# Altium footprint library Generic Footprint.PcbLib: 160 footprints (part 17 of 20) (continued)
## Symbol_FCC-Logo-9x6mm_Silkscreen [mm] (continued)
1(3.918,3.695) 1(3.918,3.705) 1(3.918,3.715) 1(3.918,5.235) 1(3.918,5.245) 1(3.918,5.255) 1(3.928,0.971) 1(3.928,0.981) 1(3.928,0.992) 1(3.928,1.002) 1(3.928,2.481) 1(3.928,2.491) 1(3.928,2.501) 1(3.928,2.511) 1(3.928,2.532) 1(3.928,2.542) 1(3.928,2.562) 1(3.928,2.603) 1(3.928,2.613) 1(3.928,2.624) 1(3.928,2.634) 1(3.928,2.644) 1(3.928,3.603) 1(3.928,3.613) 1(3.928,3.623) 1(3.928,3.633) 1(3.928,3.695) 1(3.928,3.705) 1(3.928,3.715) 1(3.928,3.735) 1(3.928,3.746) 1(3.928,5.255) 1(3.928,5.265) 1(3.928,5.276) 1(3.938,0.961) 1(3.938,0.981) 1(3.938,0.992) 1(3.938,2.481) 1(3.938,2.562) 1(3.938,2.573) 1(3.938,2.583) 1(3.938,2.593) 1(3.938,3.644) 1(3.938,3.654) 1(3.938,3.664) 1(3.938,3.674) 1(3.938,3.684) 1(3.938,3.695) 1(3.938,3.725) 1(3.938,3.756) 1(3.938,3.766) 1(3.938,5.245) 1(3.938,5.265) 1(3.948,0.951) 1(3.948,0.971) 1(3.948,0.981) 1(3.948,2.44) 1(3.948,2.45) 1(3.948,2.46) 1(3.948,2.471) 1(3.948,2.481) 1(3.948,2.491) 1(3.948,2.501) 1(3.948,2.511) 1(3.948,2.522) 1(3.948,2.532) 1(3.948,2.542) 1(3.948,2.552) 1(3.948,3.705) 1(3.948,3.715) 1(3.948,3.725) 1(3.948,3.735) 1(3.948,3.746) 1(3.948,3.756) 1(3.948,3.776) 1(3.948,3.786) 1(3.948,3.797) 1(3.948,5.255) 1(3.948,5.265) 1(3.948,5.276) 1(3.948,5.286) 1(3.959,0.961) 1(3.959,0.971) 1(3.959,2.42) 1(3.959,2.43) 1(3.959,2.45) 1(3.959,2.46) 1(3.959,2.471) 1(3.959,2.491) 1(3.959,2.501) 1(3.959,2.511) 1(3.959,3.725) 1(3.959,3.735) 1(3.959,3.746) 1(3.959,3.756) 1(3.959,3.776) 1(3.959,3.786) 1(3.959,3.807) 1(3.959,3.817) 1(3.959,3.827) 1(3.959,5.276) 1(3.959,5.286) 1(3.959,5.296) 1(3.969,0.941) 1(3.969,0.951) 1(3.969,0.961) 1(3.969,2.389) 1(3.969,2.399) 1(3.969,2.42) 1(3.969,2.43) 1(3.969,2.45) 1(3.969,2.46) 1(3.969,2.471) 1(3.969,3.776) 1(3.969,3.786) 1(3.969,3.807) 1(3.969,3.817) 1(3.969,3.827) 1(3.969,3.837) 1(3.969,3.848) 1(3.969,3.858) 1(3.969,3.868) 1(3.969,5.286) 1(3.969,5.306) 1(3.979,0.92) 1(3.979,0.93) 1(3.979,0.941) 1(3.979,0.951) 1(3.979,2.389) 1(3.979,2.399) 1(3.979,2.409) 1(3.979,2.42) 1(3.979,2.43) 1(3.979,3.807) 1(3.979,3.817) 1(3.979,3.827) 1(3.979,3.848) 1(3.979,3.858) 1(3.979,3.868) 1(3.979,5.316) 1(3.989,0.91) 1(3.989,0.941) 1(3.989,2.379) 1(3.989,2.389) 1(3.989,3.858) 1(3.989,5.327) 1(3.999,0.9) 1(3.999,0.92) 1(3.999,2.307) 1(3.999,2.399) 1(3.999,3.848) 1(3.999,3.868) 1(3.999,3.939) 1(3.999,5.337) 1(4.01,0.91) 1(4.01,0.92) 1(4.01,2.267) 1(4.01,2.277) 1(4.01,2.287) 1(4.01,2.307) 1(4.01,2.338) 1(4.01,2.348) 1(4.01,2.358) 1(4.01,2.369) 1(4.01,3.878) 1(4.01,3.888) 1(4.01,3.899) 1(4.01,3.939) 1(4.01,3.96) 1(4.01,3.97) 1(4.01,3.98) 1(4.01,5.337) 1(4.01,5.347) 1(4.02,0.89) 1(4.02,0.9) 1(4.02,0.91) 1(4.02,2.246) 1(4.02,2.267) 1(4.02,2.277) 1(4.02,2.287) 1(4.02,2.307) 1(4.02,2.318) 1(4.02,2.328) 1(4.02,3.909) 1(4.02,3.919) 1(4.02,3.929) 1(4.02,3.939) 1(4.02,3.96) 1(4.02,3.97) 1(4.02,3.98) 1(4.02,3.99) 1(4.02,4.001) 1(4.02,5.337) 1(4.02,5.347) 1(4.02,5.357) 1(4.03,0.869) 1(4.03,0.879) 1(4.03,0.89) 1(4.03,0.9) 1(4.03,2.216) 1(4.03,2.226) 1(4.03,2.236) 1(4.03,2.246) 1(4.03,2.267) 1(4.03,2.287) 1(4.03,2.297) 1(4.03,3.95) 1(4.03,3.96) 1(4.03,3.98) 1(4.03,3.99) 1(4.03,4.001) 1(4.03,4.011) 1(4.03,4.021) 1(4.03,5.347) 1(4.03,5.357) 1(4.03,5.367) 1(4.03,5.378) 1(4.04,0.879) 1(4.04,2.246) 1(4.04,2.256) 1(4.04,2.277) 1(4.04,3.97) 1(4.04,3.99) 1(4.04,4.031) 1(4.04,5.357) 1(4.05,0.869) 1(4.05,0.879) 1(4.05,0.89) 1(4.05,2.185) 1(4.05,2.195) 1(4.05,2.205) 1(4.05,2.226) 1(4.05,4.001) 1(4.05,4.021) 1(4.05,4.041) 1(4.05,4.052) 1(4.05,4.062) 1(4.05,5.388) 1(4.061,0.859) 1(4.061,2.175) 1(4.061,2.195) 1(4.061,2.226) 1(4.061,4.021) 1(4.061,4.052) 1(4.061,4.062) 1(4.061,4.072) 1(4.061,4.082) 1(4.061,5.398) 1(4.071,0.849) 1(4.071,0.859) 1(4.071,0.869) 1(4.071,2.154) 1(4.071,2.175) 1(4.071,2.195) 1(4.071,4.052) 1(4.071,4.062) 1(4.071,4.072) 1(4.071,4.082) 1(4.071,4.092) 1(4.081,0.839) 1(4.081,0.849) 1(4.081,0.859) 1(4.081,2.154) 1(4.081,2.165) 1(4.081,2.175) 1(4.081,4.072) 1(4.081,4.082) 1(4.081,4.092) 1(4.081,5.408) 1(4.091,0.828) 1(4.091,0.839) 1(4.091,0.849) 1(4.091,2.103) 1(4.091,2.134) 1(4.091,2.144) 1(4.091,2.154) 1(4.091,4.092) 1(4.091,4.143) 1(4.091,5.418) 1(4.101,0.808) 1(4.101,0.818) 1(4.101,0.828) 1(4.101,2.103) 1(4.101,4.103) 1(4.101,4.113) 1(4.101,4.143) 1(4.101,4.164) 1(4.101,4.174) 1(4.101,5.408) 1(4.101,5.418) 1(4.101,5.429) 1(4.112,0.798) 1(4.112,0.818) 1(4.112,0.828) 1(4.112,0.839) 1(4.112,2.063) 1(4.112,2.073) 1(4.112,2.103) 1(4.112,2.114) 1(4.112,2.124) 1(4.112,4.123) 1(4.112,4.133) 1(4.112,4.143) 1(4.112,4.164) 1(4.112,4.184) 1(4.112,4.194) 1(4.112,5.408) 1(4.112,5.418) 1(4.112,5.429) 1(4.112,5.439) 1(4.122,0.808) 1(4.122,0.818) 1(4.122,2.042) 1(4.122,2.052) 1(4.122,2.063) 1(4.122,2.073) 1(4.122,2.083) 1(4.122,2.093) 1(4.122,4.154) 1(4.122,4.164) 1(4.122,4.174) 1(4.122,4.184) 1(4.122,4.194) 1(4.122,4.205) 1(4.122,5.429) 1(4.122,5.439) 1(4.122,5.449) 1(4.132,0.788) 1(4.132,0.798) 1(4.132,0.808) 1(4.132,2.012) 1(4.132,2.022) 1(4.132,2.032) 1(4.132,2.042) 1(4.132,2.052) 1(4.132,2.063) 1(4.132,4.174) 1(4.132,4.184) 1(4.132,4.194) 1(4.132,4.205) 1(4.132,4.215) 1(4.132,4.225) 1(4.132,5.439) 1(4.132,5.459) 1(4.142,2.052) 1(4.142,2.073) 1(4.142,4.205) 1(4.142,4.215) 1(4.142,4.235) 1(4.142,5.449) 1(4.142,5.469) 1(4.152,0.777) 1(4.152,0.798) 1(4.152,1.991) 1(4.152,2.001) 1(4.152,2.022) 1(4.152,2.042) 1(4.152,4.215) 1(4.152,4.225) 1(4.152,4.245) 1(4.152,4.256) 1(4.152,5.449) 1(4.152,5.48) 1(4.163,0.767) 1(4.163,0.777) 1(4.163,0.788) 1(4.163,1.991) 1(4.163,2.022) 1(4.163,4.225) 1(4.163,4.245) 1(4.163,4.256) 1(4.163,4.266) 1(4.163,4.276) 1(4.173,0.757) 1(4.173,0.767) 1(4.173,0.788) 1(4.173,1.961) 1(4.173,1.991) 1(4.173,4.245) 1(4.173,4.256) 1(4.173,4.266) 1(4.173,4.276) 1(4.173,5.49) 1(4.183,0.747) 1(4.183,0.757) 1(4.183,0.767) 1(4.183,0.777) 1(4.183,1.961) 1(4.183,1.981) 1(4.183,4.266) 1(4.183,4.276) 1(4.183,5.49) 1(4.183,5.5) 1(4.193,0.737) 1(4.193,0.747) 1(4.193,1.92) 1(4.193,1.93) 1(4.193,1.971) 1(4.193,5.5) 1(4.193,5.51) 1(4.203,0.726) 1(4.203,0.757) 1(4.203,1.91) 1(4.203,1.93) 1(4.203,1.95) 1(4.203,1.961) 1(4.203,4.286) 1(4.203,4.296) 1(4.203,4.317) 1(4.203,4.327) 1(4.203,4.337) 1(4.203,5.49) 1(4.214,0.747) 1(4.214,1.889) 1(4.214,1.899) 1(4.214,1.91) 1(4.214,1.92) 1(4.214,1.93) 1(4.214,1.94) 1(4.214,4.307) 1(4.214,4.327) 1(4.214,4.337) 1(4.214,4.347) 1(4.214,4.358) 1(4.214,4.368) 1(4.224,0.706) 1(4.224,0.716) 1(4.224,0.726) 1(4.224,0.737) 1(4.224,1.869) 1(4.224,1.879) 1(4.224,1.889) 1(4.224,1.91) 1(4.224,1.92) 1(4.224,4.327) 1(4.224,4.337) 1(4.224,4.347) 1(4.224,4.358) 1(4.224,4.378) 1(4.224,5.5) 1(4.224,5.51) 1(4.224,5.531) 1(4.234,0.716) 1(4.234,0.726) 1(4.234,0.737) 1(4.234,1.859) 1(4.234,1.879) 1(4.234,1.889) 1(4.234,4.347) 1(4.234,4.358) 1(4.234,4.378) 1(4.234,4.388) 1(4.234,5.51) 1(4.234,5.52) 1(4.234,5.531) 1(4.234,5.541) 1(4.244,0.696) 1(4.244,0.706) 1(4.244,5.541) 1(4.244,5.551) 1(4.254,0.716) 1(4.254,1.859) 1(4.254,1.879) 1(4.254,4.378) 1(4.254,4.388) 1(4.254,5.531) 1(4.254,5.561) 1(4.265,0.686) 1(4.265,0.706) 1(4.265,1.859) 1(4.265,2.981) 1(4.265,2.991) 1(4.265,3.001) 1(4.265,3.011) 1(4.265,3.021) 1(4.265,3.032) 1(4.265,3.042) 1(4.265,3.052) 1(4.265,3.062) 1(4.265,3.072) 1(4.265,3.083) 1(4.265,3.093) 1(4.265,3.103) 1(4.265,3.113) 1(4.265,3.123) 1(4.265,3.134) 1(4.265,3.144) 1(4.265,3.154) 1(4.265,3.164) 1(4.265,3.174) 1(4.265,3.185) 1(4.265,3.195) 1(4.265,3.205) 1(4.265,3.215) 1(4.265,3.225) 1(4.265,3.236) 1(4.265,3.246) 1(4.265,3.256) 1(4.265,3.266) 1(4.265,4.388) 1(4.265,4.398) 1(4.265,4.409) 1(4.265,4.429) 1(4.265,5.541) 1(4.265,5.551) 1(4.275,0.675) 1(4.275,0.686) 1(4.275,0.696) 1(4.275,1.808) 1(4.275,1.828) 1(4.275,1.838) 1(4.275,1.848) 1(4.275,2.879) 1(4.275,2.889) 1(4.275,2.899) 1(4.275,2.909) 1(4.275,2.919) 1(4.275,2.93) 1(4.275,2.94) 1(4.275,2.95) 1(4.275,2.981) 1(4.275,2.991) 1(4.275,3.001) 1(4.275,3.011) 1(4.275,3.021) 1(4.275,3.032) 1(4.275,3.042) 1(4.275,3.052) 1(4.275,3.062) 1(4.275,3.072) 1(4.275,3.083) 1(4.275,3.093) 1(4.275,3.103) 1(4.275,3.113) 1(4.275,3.123) 1(4.275,3.134) 1(4.275,3.144) 1(4.275,3.154) 1(4.275,3.164) 1(4.275,3.174) 1(4.275,3.185) 1(4.275,3.195) 1(4.275,3.205) 1(4.275,3.215) 1(4.275,3.225) 1(4.275,3.236) 1(4.275,3.246) 1(4.275,3.256) 1(4.275,3.266) 1(4.275,3.297) 1(4.275,3.307) 1(4.275,3.317) 1(4.275,3.327) 1(4.275,3.338) 1(4.275,3.348) 1(4.275,3.358) 1(4.275,3.368) 1(4.275,4.429) 1(4.275,4.439) 1(4.275,5.551) 1(4.275,5.571) 1(4.285,0.655) 1(4.285,0.665) 1(4.285,0.675) 1(4.285,0.696) 1(4.285,1.808) 1(4.285,2.807) 1(4.285,2.817) 1(4.285,2.828) 1(4.285,2.838) 1(4.285,2.848) 1(4.285,2.879) 1(4.285,2.889) 1(4.285,2.899) 1(4.285,2.909) 1(4.285,2.919) 1(4.285,2.93) 1(4.285,2.94) 1(4.285,2.95) 1(4.285,2.97) 1(4.285,2.981) 1(4.285,2.991) 1(4.285,3.001) 1(4.285,3.011) 1(4.285,3.021) 1(4.285,3.032) 1(4.285,3.042) 1(4.285,3.052) 1(4.285,3.062) 1(4.285,3.072) 1(4.285,3.083) 1(4.285,3.093) 1(4.285,3.103) 1(4.285,3.113) 1(4.285,3.123) 1(4.285,3.134) 1(4.285,3.144) 1(4.285,3.154) 1(4.285,3.164) 1(4.285,3.174) 1(4.285,3.185) 1(4.285,3.195) 1(4.285,3.205) 1(4.285,3.215) 1(4.285,3.225) 1(4.285,3.236) 1(4.285,3.246) 1(4.285,3.256) 1(4.285,3.266) 1(4.285,3.276) 1(4.285,3.297) 1(4.285,3.307) 1(4.285,3.317) 1(4.285,3.327) 1(4.285,3.338) 1(4.285,3.348) 1(4.285,3.358) 1(4.285,3.368) 1(4.285,3.389) 1(4.285,3.399) 1(4.285,3.409) 1(4.285,3.419) 1(4.285,3.429) 1(4.285,3.44) 1(4.285,4.419) 1(4.285,4.439) 1(4.285,4.46) 1(4.285,5.582) 1(4.295,0.686) 1(4.295,1.787) 1(4.295,1.797) 1(4.295,1.808) 1(4.295,1.818) 1(4.295,2.746) 1(4.295,2.756) 1(4.295,2.766) 1(4.295,2.777) 1(4.295,2.787) 1(4.295,2.797) 1(4.295,2.807) 1(4.295,2.858) 1(4.295,2.96) 1(4.295,3.44) 1(4.295,3.45) 1(4.295,3.46) 1(4.295,3.47) 1(4.295,3.48) 1(4.295,3.491) 1(4.295,4.429) 1(4.295,4.439) 1(4.295,4.47) 1(4.295,5.582) 1(4.295,5.592) 1(4.305,0.675) 1(4.305,1.757) 1(4.305,1.767) 1(4.305,2.695) 1(4.305,2.705) 1(4.305,2.715) 1(4.305,2.726) 1(4.305,2.736) 1(4.305,2.817) 1(4.305,2.828) 1(4.305,2.838) 1(4.305,2.848) 1(4.305,2.858) 1(4.305,2.868) 1(4.305,2.879) 1(4.305,2.889) 1(4.305,2.899) 1(4.305,2.909) 1(4.305,2.919) 1(4.305,2.93) 1(4.305,2.94) 1(4.305,2.95) 1(4.305,3.287) 1(4.305,3.297) 1(4.305,3.307) 1(4.305,3.317) 1(4.305,3.327) 1(4.305,3.338) 1(4.305,3.348) 1(4.305,3.358) 1(4.305,3.368) 1(4.305,3.378) 1(4.305,3.389) 1(4.305,3.399) 1(4.305,3.409) 1(4.305,3.419) 1(4.305,3.429) 1(4.305,3.501) 1(4.305,3.511) 1(4.305,3.521) 1(4.305,3.531) 1(4.305,3.542) 1(4.305,3.552) 1(4.305,4.449) 1(4.305,4.46) 1(4.305,4.47) 1(4.305,4.48) 1(4.305,4.49) 1(4.305,5.602) 1(4.316,0.645) 1(4.316,1.746) 1(4.316,1.757) 1(4.316,1.767) 1(4.316,1.777) 1(4.316,2.654) 1(4.316,2.664) 1(4.316,2.675) 1(4.316,2.685) 1(4.316,2.756) 1(4.316,2.777) 1(4.316,2.807) 1(4.316,2.817) 1(4.316,2.828) 1(4.316,2.838) 1(4.316,2.848) 1(4.316,2.858) 1(4.316,3.389) 1(4.316,3.399) 1(4.316,3.409) 1(4.316,3.419) 1(4.316,3.429) 1(4.316,3.44) 1(4.316,3.47) 1(4.316,3.491) 1(4.316,3.562) 1(4.316,3.572) 1(4.316,3.582) 1(4.316,3.593) 1(4.316,4.46) 1(4.316,4.47) 1(4.316,4.49) 1(4.316,4.5) 1(4.326,0.635) 1(4.326,1.726) 1(4.326,1.736) 1(4.326,1.757) 1(4.326,1.767) 1(4.326,2.624) 1(4.326,2.634) 1(4.326,2.644) 1(4.326,2.654) 1(4.326,2.664) 1(4.326,2.756) 1(4.326,2.777) 1(4.326,3.47) 1(4.326,3.491) 1(4.326,3.572) 1(4.326,3.593) 1(4.326,3.603) 1(4.326,3.613) 1(4.326,3.623) 1(4.326,4.5) 1(4.326,4.511) 1(4.326,5.582) 1(4.326,5.592) 1(4.326,5.612) 1(4.336,0.624) 1(4.336,0.645) 1(4.336,1.736) 1(4.336,2.583) 1(4.336,2.624) 1(4.336,2.654) 1(4.336,2.664) 1(4.336,3.572) 1(4.336,3.593) 1(4.336,3.603) 1(4.336,3.613) 1(4.336,3.623) 1(4.336,3.633) 1(4.336,3.664) 1(4.336,4.49) 1(4.336,4.511) 1(4.336,4.521) 1(4.336,5.592) 1(4.336,5.602) 1(4.336,5.622) 1(4.346,1.716) 1(4.346,1.726) 1(4.346,1.736) 1(4.346,2.573) 1(4.346,2.593) 1(4.346,2.603) 1(4.346,3.633) 1(4.346,3.644) 1(4.346,3.654) 1(4.346,4.5) 1(4.346,4.521) 1(4.346,5.602) 1(4.346,5.612) 1(4.346,5.633) 1(4.356,0.614) 1(4.356,0.645) 1(4.356,1.716) 1(4.356,1.726) 1(4.356,2.542) 1(4.356,2.552) 1(4.356,2.562) 1(4.356,2.573) 1(4.356,2.583) 1(4.356,2.593) 1(4.356,2.603) 1(4.356,2.613) 1(4.356,2.624) 1(4.356,3.603) 1(4.356,3.613) 1(4.356,3.623) 1(4.356,3.633) 1(4.356,3.644) 1(4.356,3.654) 1(4.356,3.664) 1(4.356,3.684) 1(4.356,3.695) 1(4.356,3.705) 1(4.356,4.511) 1(4.367,0.604) 1(4.367,0.614) 1(4.367,0.624) 1(4.367,1.675) 1(4.367,1.685) 1(4.367,1.716) 1(4.367,2.491) 1(4.367,2.501) 1(4.367,2.511) 1(4.367,2.522) 1(4.367,2.542) 1(4.367,2.552) 1(4.367,2.573) 1(4.367,2.583) 1(4.367,2.593) 1(4.367,2.603) 1(4.367,3.644) 1(4.367,3.654) 1(4.367,3.664) 1(4.367,3.674) 1(4.367,3.684) 1(4.367,3.695) 1(4.367,3.705) 1(4.367,3.725) 1(4.367,3.735) 1(4.367,3.746) 1(4.367,4.521) 1(4.367,4.531) 1(4.367,4.562) 1(4.367,5.612) 1(4.367,5.643) 1(4.377,1.665) 1(4.377,1.685) 1(4.377,1.695) 1(4.377,1.706) 1(4.377,2.45) 1(4.377,2.481) 1(4.377,2.491) 1(4.377,2.501) 1(4.377,2.511) 1(4.377,2.522) 1(4.377,2.542) 1(4.377,2.552) 1(4.377,3.684) 1(4.377,3.695) 1(4.377,3.705) 1(4.377,3.725) 1(4.377,3.735) 1(4.377,3.746) 1(4.377,3.756) 1(4.377,3.766) 1(4.377,3.786) 1(4.377,3.797) 1(4.377,4.541) 1(4.377,4.562) 1(4.377,4.572) 1(4.377,4.582) 1(4.377,5.653) 1(4.387,0.594) 1(4.387,0.604) 1(4.387,0.614) 1(4.387,0.624) 1(4.387,1.655) 1(4.387,1.675) 1(4.387,1.685) 1(4.387,2.42) 1(4.387,2.46) 1(4.387,2.471) 1(4.387,2.481) 1(4.387,2.501) 1(4.387,2.511) 1(4.387,2.522) 1(4.387,2.532) 1(4.387,3.715) 1(4.387,3.725) 1(4.387,3.735) 1(4.387,3.746) 1(4.387,3.756) 1(4.387,3.766) 1(4.387,4.551) 1(4.387,4.572) 1(4.387,5.643) 1(4.397,0.584) 1(4.397,1.644) 1(4.397,1.665) 1(4.397,2.43) 1(4.397,2.44) 1(4.397,3.807) 1(4.397,3.817) 1(4.397,3.827) 1(4.397,4.562) 1(4.397,4.582) 1(4.397,4.592) 1(4.397,4.602) 1(4.397,5.663) 1(4.407,0.573) 1(4.407,0.594) 1(4.407,0.604) 1(4.407,1.634) 1(4.407,1.644) 1(4.407,1.655) 1(4.407,1.665) 1(4.407,1.675) 1(4.407,2.389) 1(4.407,2.399) 1(4.407,2.409) 1(4.407,2.481) 1(4.407,2.491) 1(4.407,3.756) 1(4.407,3.766) 1(4.407,3.776) 1(4.407,3.837) 1(4.407,3.848) 1(4.407,4.572) 1(4.407,4.582) 1(4.407,4.602) 1(4.407,5.643) 1(4.418,0.563) 1(4.418,0.584) 1(4.418,0.594) 1(4.418,1.614) 1(4.418,1.644) 1(4.418,1.655) 1(4.418,2.379) 1(4.418,2.399) 1(4.418,3.848) 1(4.418,3.858) 1(4.418,3.868) 1(4.418,4.602) 1(4.418,4.623) 1(4.418,4.633) 1(4.418,5.673) 1(4.428,0.584) 1(4.428,1.604) 1(4.428,2.338) 1(4.428,2.348) 1(4.428,2.358) 1(4.428,2.379) 1(4.428,2.399) 1(4.428,3.848) 1(4.428,3.868) 1(4.428,3.888) 1(4.428,3.899) 1(4.428,3.909) 1(4.428,4.613) 1(4.428,4.623) 1(4.438,0.553) 1(4.438,1.614) 1(4.438,1.624) 1(4.438,2.318) 1(4.438,2.338) 1(4.438,2.348) 1(4.438,2.358) 1(4.438,2.369) 1(4.438,2.379) 1(4.438,3.868) 1(4.438,3.878) 1(4.438,3.888) 1(4.438,3.899) 1(4.438,3.909) 1(4.438,3.919) 1(4.438,4.633) 1(4.438,5.673) 1(4.438,5.684) 1(4.438,5.694) 1(4.448,0.543) 1(4.448,1.604) 1(4.448,2.328) 1(4.448,2.358) 1(4.448,3.909) 1(4.448,4.623) 1(4.448,5.684) 1(4.458,1.583) 1(4.458,1.614) 1(4.458,2.277) 1(4.458,2.297) 1(4.458,2.318) 1(4.458,2.328) 1(4.458,2.338) 1(4.458,2.348) 1(4.458,3.888) 1(4.458,3.899) 1(4.458,3.919) 1(4.458,3.939) 1(4.458,3.95) 1(4.458,3.97) 1(4.458,4.633) 1(4.458,4.664) 1(4.458,5.673) 1(4.458,5.694) 1(4.458,5.704) 1(4.469,0.553) 1(4.469,1.563) 1(4.469,1.573) 1(4.469,1.583) 1(4.469,1.593) 1(4.469,1.604) 1(4.469,2.246) 1(4.469,2.256) 1(4.469,2.267) 1(4.469,2.297) 1(4.469,2.307) 1(4.469,2.318) 1(4.469,2.328) 1(4.469,3.919) 1(4.469,3.929) 1(4.469,3.95) 1(4.469,3.98) 1(4.469,3.99) 1(4.469,4.643) 1(4.469,4.653) 1(4.469,4.664) 1(4.469,4.674) 1(4.469,5.684) 1(4.479,0.533) 1(4.479,1.553) 1(4.479,1.573) 1(4.479,1.583) 1(4.479,2.236) 1(4.479,2.267) 1(4.479,2.277) 1(4.479,2.297) 1(4.479,3.95) 1(4.479,3.97) 1(4.479,3.98) 1(4.479,4.001) 1(4.479,4.011) 1(4.479,4.674) 1(4.479,4.684) 1(4.479,4.694) 1(4.479,5.694) 1(4.479,5.704) 1(4.479,5.714) 1(4.489,0.543) 1(4.489,0.553) 1(4.489,1.542) 1(4.489,1.563) 1(4.489,1.573) 1(4.489,2.226) 1(4.489,2.246) 1(4.489,2.267) 1(4.489,2.277) 1(4.489,2.287) 1(4.489,3.96) 1(4.489,3.97) 1(4.489,3.98) 1(4.489,4.021) 1(4.489,4.664) 1(4.489,4.684) 1(4.499,0.522) 1(4.499,0.533) 1(4.499,0.543) 1(4.499,1.532) 1(4.499,1.553) 1(4.499,1.563) 1(4.499,2.216) 1(4.499,2.246) 1(4.499,4.011) 1(4.499,4.674) 1(4.499,4.694) 1(4.499,4.704) 1(4.499,5.704) 1(4.499,5.714) 1(4.499,5.724) 1(4.509,0.512) 1(4.509,1.522) 1(4.509,1.542) 1(4.509,1.553) 1(4.509,2.195) 1(4.509,2.205) 1(4.509,2.216) 1(4.509,2.226) 1(4.509,4.011) 1(4.509,4.031) 1(4.509,4.041) 1(4.509,4.052) 1(4.509,4.684) 1(4.509,4.704) 1(4.509,4.715) 1(4.509,5.714) 1(4.509,5.735) 1(4.52,0.533) 1(4.52,1.512) 1(4.52,1.522) 1(4.52,1.532) 1(4.52,1.542) 1(4.52,2.175) 1(4.52,2.195) 1(4.52,2.216) 1(4.52,2.226) 1(4.52,4.041) 1(4.52,4.052) 1(4.52,4.072) 1(4.52,4.694) 1(4.52,4.704) 1(4.52,4.715) 1(4.52,5.745) 1(4.53,0.492) 1(4.53,0.502) 1(4.53,0.512) 1(4.53,1.532) 1(4.53,2.175) 1(4.53,2.185) 1(4.53,2.195) 1(4.53,4.041) 1(4.53,4.052) 1(4.53,4.072) 1(4.53,4.092) 1(4.53,4.103) 1(4.53,4.715) 1(4.54,0.502) 1(4.54,0.512) 1(4.54,1.512) 1(4.54,1.522) 1(4.54,2.144) 1(4.54,2.175) 1(4.54,4.062) 1(4.54,4.072) 1(4.54,4.092) 1(4.54,4.745) 1(4.54,5.755) 1(4.55,0.482) 1(4.55,1.491) 1(4.55,2.114) 1(4.55,2.124) 1(4.55,2.165) 1(4.55,4.082) 1(4.55,4.103) 1(4.55,4.123) 1(4.55,4.133) 1(4.55,4.725) 1(4.55,4.745) 1(4.55,4.755) 1(4.56,0.492) 1(4.56,0.502) 1(4.56,1.471) 1(4.56,1.481) 1(4.56,1.491) 1(4.56,1.512) 1(4.56,2.124) 1(4.56,2.144) 1(4.56,2.154) 1(4.56,4.092) 1(4.56,4.103) 1(4.56,4.113) 1(4.56,4.735) 1(4.56,4.766) 1(4.56,5.765) 1(4.571,0.492) 1(4.571,1.461) 1(4.571,1.481) 1(4.571,1.491) 1(4.571,1.502) 1(4.571,2.083) 1(4.571,2.093) 1(4.571,2.114) 1(4.571,2.134) 1(4.571,2.144) 1(4.571,4.123) 1(4.571,4.133) 1(4.571,4.143) 1(4.571,4.154) 1(4.571,4.164) 1(4.571,4.745) 1(4.571,4.755) 1(4.571,4.766) 1(4.571,4.776) 1(4.571,5.755) 1(4.571,5.775) 1(4.581,0.461) 1(4.581,0.471) 1(4.581,1.451) 1(4.581,1.471) 1(4.581,1.481) 1(4.581,2.073) 1(4.581,2.103) 1(4.581,2.114) 1(4.581,2.124) 1(4.581,4.123) 1(4.581,4.133) 1(4.581,4.174) 1(4.581,4.755) 1(4.581,4.766) 1(4.581,4.776) 1(4.581,4.786) 1(4.581,4.796) 1(4.581,5.755) 1(4.591,1.44) 1(4.591,1.461) 1(4.591,1.471) 1(4.591,2.052) 1(4.591,2.063) 1(4.591,4.184) 1(4.591,4.786) 1(4.591,5.765) 1(4.591,5.775) 1(4.591,5.786) 1(4.601,0.451) 1(4.601,1.451) 1(4.601,1.461) 1(4.601,2.042) 1(4.601,4.194) 1(4.601,4.205) 1(4.601,4.776) 1(4.601,4.796) 1(4.601,4.806) 1(4.611,1.44) 1(4.611,1.451) 1(4.611,2.032) 1(4.611,2.052) 1(4.611,2.063) 1(4.611,4.184) 1(4.611,4.194) 1(4.611,4.215) 1(4.611,4.786) 1(4.611,4.806) 1(4.611,5.765) 1(4.611,5.786) 1(4.611,5.796) 1(4.622,0.441) 1(4.622,0.461) 1(4.622,1.41) 1(4.622,1.42) 1(4.622,1.44) 1(4.622,2.042) 1(4.622,2.052) 1(4.622,2.063) 1(4.622,4.184) 1(4.622,4.194) 1(4.622,4.205) 1(4.622,4.796) 1(4.622,4.806) 1(4.622,5.775) 1(4.632,0.451) 1(4.632,0.461) 1(4.632,1.41) 1(4.632,1.42) 1(4.632,1.43) 1(4.632,1.991) 1(4.632,2.001) 1(4.632,2.032) 1(4.632,2.042) 1(4.632,4.205) 1(4.632,4.215) 1(4.632,4.235) 1(4.632,4.245) 1(4.632,4.817) 1(4.632,4.837) 1(4.632,5.786) 1(4.632,5.806) 1(4.642,1.42) 1(4.642,1.981) 1(4.642,2.001) 1(4.642,2.022) 1(4.642,2.032) 1(4.642,4.215) 1(4.642,4.225) 1(4.642,4.235) 1(4.642,4.245) 1(4.642,4.256) 1(4.642,4.837) 1(4.642,4.847) 1(4.642,5.816) 1(4.652,0.431) 1(4.652,0.441) 1(4.652,0.451) 1(4.652,2.012) 1(4.652,4.235) 1(4.652,4.266) 1(4.652,4.827) 1(4.652,4.847) 1(4.652,5.806) 1(4.662,1.379) 1(4.662,1.389) 1(4.662,1.41) 1(4.662,1.961) 1(4.662,1.971) 1(4.662,2.001) 1(4.662,4.245) 1(4.662,4.276) 1(4.662,4.286) 1(4.662,4.837) 1(4.662,5.826) 1(4.673,1.369) 1(4.673,1.389) 1(4.673,1.95) 1(4.673,1.971) 1(4.673,4.276) 1(4.673,4.296) 1(4.673,4.847) 1(4.673,4.868) 1(4.673,4.878) 1(4.673,5.806) 1(4.673,5.816) 1(4.673,5.837) 1(4.683,0.41) 1(4.683,0.42) 1(4.683,0.431) 1(4.683,0.441) 1(4.683,1.359) 1(4.683,1.379) 1(4.683,1.389) 1(4.683,1.4) 1(4.683,1.94) 1(4.683,1.95) 1(4.683,1.961) 1(4.683,1.971) 1(4.683,4.276) 1(4.683,4.286) 1(4.683,4.296) 1(4.683,4.307) 1(4.683,4.857) 1(4.683,4.868) 1(4.683,5.816) 1(4.693,0.4) 1(4.693,0.41) 1(4.693,0.42) 1(4.693,0.431) 1(4.693,1.349) 1(4.693,1.369) 1(4.693,1.379) 1(4.693,1.93) 1(4.693,1.94) 1(4.693,1.961) 1(4.693,4.286) 1(4.693,4.296) 1(4.693,4.307) 1(4.693,4.317) 1(4.693,4.868) 1(4.693,4.878) 1(4.693,4.888) 1(4.693,5.847) 1(4.703,0.41) 1(4.703,0.42) 1(4.703,1.359) 1(4.703,1.369) 